# Altium footprint library 自建库.PcbLib: 169 footprints (part 8 of 11)
Each footprint in its own frame and in the unit in brackets; x right, y up, seen from the top. Pads: shape width x height; smd on the part's side, far side on the other; paste and mask are expansions set on the pad; w line width, h text height; cw(c..) or ccw(c..) is an arc to the next point about the centre after c.
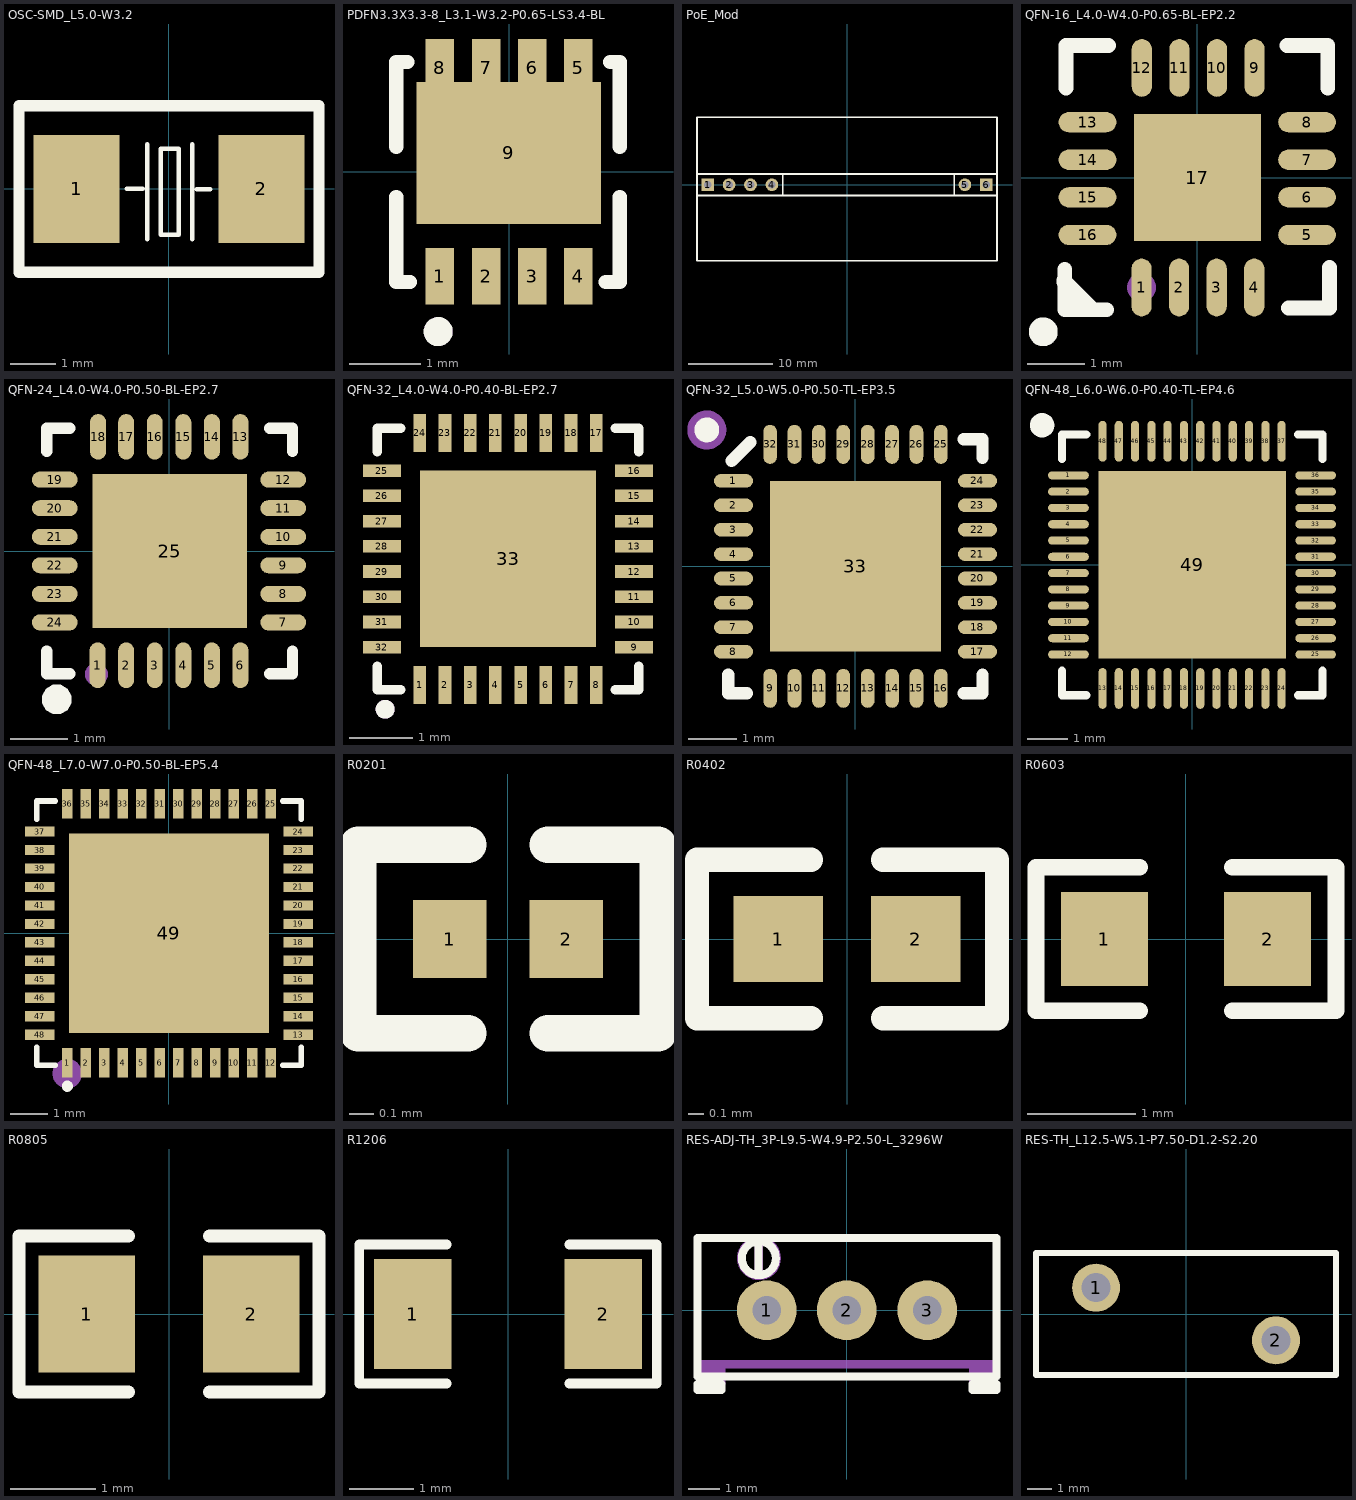
[diagram p7: the footprints below, top view; thin cyan lines are the x and y axes]

## OSC-SMD_L5.0-W3.2 [mm]
pads (2):
  rect 1.9x2.4 smd: 1(-2.05,0) 2(2.05,0)
Top Overlay:
  lines w0.1: -0.94,0 -0.584,0 ; -0.483,-1.109 -0.483,0.991 ; 0.517,-1.109 0.517,0.991 ; 0.617,-0.009 0.917,-0.009 ; -0.183,-1.009 -0.183,0.89 0.217,0.89 0.217,-1.009 -0.183,-1.009
  lines w0.254: -3.325,-1.85 3.325,-1.85 3.325,-0.7 3.325,0.7 3.325,1.85 -3.325,1.85 -3.325,0.7 -3.325,-0.7 -3.325,-1.85
3D body "OSC-5032_2.STEP": height 1.2, standoff -0.01, extent -2.569,-1.613 2.431,1.587

## PDFN3.3X3.3-8_L3.1-W3.2-P0.65-LS3.4-BL [mm]
pads (9):
  rect 0.4x0.8 smd paste-100 mask+0.051: 1(-0.975,-1.47) 2(-0.325,-1.47) 3(0.325,-1.47) 4(0.975,-1.47) 5(0.975,1.47) 6(0.325,1.47) 7(-0.325,1.47) 8(-0.975,1.47)
  rect 2.6x2 smd paste-100 mask+0.051: 9(-0.005,0.269)
Top Overlay:
  circle w0.2: c-1,-2.25 r0.105
  lines w0.2: -1.592,-0.354 -1.592,-1.55 -1.396,-1.55 ; -1.592,0.354 -1.592,1.55 -1.434,1.55 ; 1.362,-1.55 1.56,-1.55 1.56,-0.354 ; 1.425,1.55 1.56,1.55 1.56,0.354
Top Paste:
  region: -1.307,1.138 1.295,1.138 1.295,-0.731 -1.305,-0.731 -1.305,-0.73
  region: -1.175,-1.87 -1.175,-1.07 -0.775,-1.07 -0.775,-1.87
  region: -0.525,-1.87 -0.525,-1.07 -0.125,-1.07 -0.125,-1.87
  region: 0.125,-1.87 0.125,-1.07 0.525,-1.07 0.525,-1.87
  region: 0.775,-1.87 0.775,-1.07 1.175,-1.07 1.175,-1.87
  region: 1.175,1.47 0.775,1.47 0.775,1.87 1.175,1.87
  region: 0.525,1.47 0.125,1.47 0.125,1.87 0.525,1.87
  region: -0.125,1.47 -0.525,1.47 -0.525,1.87 -0.125,1.87
  region: -0.775,1.473 -1.175,1.473 -1.175,1.873 -0.775,1.873
Mechanical 15:
  circle w0.2: c-1,-2.25 r0.1
3D body "C2839901.stp": height 0.82, standoff 0, extent -1.65,-1.612 1.65,1.739

## PoE_Mod [mm] "PoE模块"
pads (6):
  rect 1.5x1.5 hole 0.9: 1(-16.53,0) 6(16.53,0)
  round 1.5 hole 0.9: 2(-13.99,0) 3(-11.45,0) 4(-8.91,0) 5(13.99,0)
Top Overlay:
  lines w0.2: -17.8,-1.27 -17.8,-9 17.8,-9 17.8,-1.27 ; -17.8,-1.27 -7.64,-1.27 -7.64,1.27 -17.8,1.27 ; -17.8,-1.27 -17.8,1.27 ; -17.8,-1.27 17.8,-1.27 ; -17.8,1.27 -17.8,8 17.8,8 17.8,1.27 ; -17.8,1.27 17.8,1.27 ; 17.8,-1.27 17.8,1.27 ; 17.8,-1.27 12.72,-1.27 12.72,1.27 17.8,1.27 ; 17.8,-1.27 17.8,1.27
3D body "POE_Mode.stp": height 14, standoff -1.8, extent -17.676,-7.747 18.184,6.053

## QFN-16_L4.0-W4.0-P0.65-BL-EP2.2 [mm]
pads (17):
  oval 0.35x1 smd: 1(-0.965,-1.9) 2(-0.315,-1.9) 3(0.335,-1.9) 4(0.986,-1.9) 9(0.991,1.9) 10(0.34,1.9) 11(-0.31,1.9) 12(-0.96,1.9)
  oval 1x0.35 smd: 5(1.9,-0.991) 6(1.9,-0.34) 7(1.9,0.31) 8(1.9,0.96) 13(-1.9,0.96) 14(-1.9,0.31) 15(-1.9,-0.34) 16(-1.9,-0.991)
  rect 2.2x2.2 smd: 17(0,0)
Top Overlay:
  circle w0.25: c-2.667,-2.667 r0.125
  region: -2.315,-1.777 -2.307,-2.302 -1.781,-2.302
  lines w0.254: -2.307,-1.809 -2.307,-1.774 ; -2.295,-1.793 -1.802,-2.286 ; -2.295,-1.583 -2.295,-2.286 -1.566,-2.286 ; -2.272,1.552 -2.272,2.286 -1.538,2.286 ; 1.553,2.286 2.257,2.286 2.257,1.552 ; 1.578,-2.257 2.286,-2.257 2.286,-1.553
Mechanical 15:
  circle w0.25: c-0.965,-1.9 r0.125
3D body "QFN16 4x4.STEP": height 0.92, standoff 0, extent -2,-2 2,2

## QFN-24_L4.0-W4.0-P0.50-BL-EP2.7 [mm]
pads (25):
  oval 0.28x0.8 smd: 1(-1.25,-2) 2(-0.75,-2) 3(-0.25,-2) 4(0.25,-2) 5(0.75,-2) 6(1.25,-2) 13(1.25,2) 14(0.75,2) 15(0.25,2) 16(-0.25,2) 17(-0.75,2) 18(-1.242,2)
  oval 0.8x0.28 smd: 7(2,-1.25) 8(2,-0.75) 9(2,-0.25) 10(2,0.25) 11(2,0.75) 12(2,1.25) 19(-2,1.25) 20(-2,0.75) 21(-2,0.25) 22(-2,-0.25) 23(-2,-0.75) 24(-2,-1.25)
  rect 2.7x2.7 smd: 25(0.012,0)
Top Overlay:
  region: -1.709,-2.598 -1.71,-2.53 -1.778,-2.413 -1.896,-2.345 -2.032,-2.346 -2.149,-2.414 -2.217,-2.532 -2.217,-2.668 -2.149,-2.785 -2.032,-2.853 -1.896,-2.854 -1.778,-2.786 -1.71,-2.669 -1.709,-2.601
  lines w0.2: -2.138,-1.75 -2.138,-2.15 -1.738,-2.15 ; -2.138,1.75 -2.138,2.15 -1.738,2.15 ; 1.763,-2.15 2.163,-2.15 2.163,-1.75 ; 1.763,2.15 2.163,2.15 2.163,1.75
Top Paste:
  drawing of 25 lines, arcs and shapes, not listed
Mechanical 15:
  circle w0.2: c-1.27,-2.159 r0.1
3D body "qfn-24.STEP": height 0.88, standoff -0.02, extent -2.02,-2.02 2.02,2.02

## QFN-32_L4.0-W4.0-P0.40-BL-EP2.7 [mm]
pads (33):
  rect 0.2x0.6 smd: 1(467.528,-331.212) 2(467.928,-331.212) 3(468.328,-331.212) 4(468.728,-331.212) 5(469.128,-331.212) 6(469.528,-331.212) 7(469.928,-331.212) 8(470.328,-331.212) 17(470.328,-327.212) 18(469.928,-327.212) 19(469.528,-327.212) 20(469.128,-327.212) 21(468.728,-327.212) 22(468.328,-327.212) 23(467.928,-327.212) 24(467.528,-327.212)
  rect 0.6x0.2 smd: 9(470.928,-330.612) 10(470.928,-330.212) 11(470.928,-329.811) 12(470.928,-329.411) 13(470.928,-329.012) 14(470.928,-328.612) 15(470.928,-328.212) 16(470.928,-327.811) 25(466.928,-327.811) 26(466.928,-328.212) 27(466.928,-328.612) 28(466.928,-329.012) 29(466.928,-329.411) 30(466.928,-329.811) 31(466.928,-330.212) 32(466.928,-330.612)
  rect 2.8x2.8 smd: 33(468.928,-329.212)
Top Overlay:
  circle w0.15: c466.979,-331.597 r0.075
  lines w0.152: 466.852,-330.914 466.852,-331.288 467.225,-331.288 ; 466.852,-327.509 466.852,-327.135 467.225,-327.135 ; 470.63,-331.288 471.004,-331.288 471.004,-330.914 ; 470.63,-327.135 471.004,-327.135 471.004,-327.509
Top Paste:
  region: 467.808,-330.332 467.808,-328.092 470.048,-328.092 470.048,-330.332
  region: 467.228,-327.911 467.228,-327.711 466.628,-327.711 466.628,-327.911
  region: 467.228,-328.312 467.228,-328.112 466.628,-328.112 466.628,-328.312
  region: 467.228,-328.712 467.228,-328.512 466.628,-328.512 466.628,-328.712
  region: 467.228,-329.112 467.228,-328.912 466.628,-328.912 466.628,-329.112
  region: 467.228,-329.511 467.228,-329.311 466.628,-329.311 466.628,-329.511
  region: 467.228,-329.911 467.228,-329.711 466.628,-329.711 466.628,-329.911
  region: 467.228,-330.312 467.228,-330.112 466.628,-330.112 466.628,-330.312
  region: 467.228,-330.712 467.228,-330.512 466.628,-330.512 466.628,-330.712
  region: 470.428,-330.912 470.228,-330.912 470.228,-331.512 470.428,-331.512
  region: 470.028,-330.912 469.828,-330.912 469.828,-331.512 470.028,-331.512
  region: 469.628,-330.912 469.428,-330.912 469.428,-331.512 469.628,-331.512
  region: 469.228,-330.912 469.028,-330.912 469.028,-331.512 469.228,-331.512
  region: 468.828,-330.912 468.628,-330.912 468.628,-331.512 468.828,-331.512
  region: 468.428,-330.912 468.228,-330.912 468.228,-331.512 468.428,-331.512
  region: 468.028,-330.912 467.828,-330.912 467.828,-331.512 468.028,-331.512
  region: 467.628,-330.912 467.428,-330.912 467.428,-331.512 467.628,-331.512
  region: 471.228,-330.712 471.228,-330.512 470.628,-330.512 470.628,-330.712
  region: 471.228,-330.312 471.228,-330.112 470.628,-330.112 470.628,-330.312
  region: 471.228,-329.911 471.228,-329.711 470.628,-329.711 470.628,-329.911
  region: 471.228,-329.511 471.228,-329.311 470.628,-329.311 470.628,-329.511
  region: 471.228,-329.112 471.228,-328.912 470.628,-328.912 470.628,-329.112
  region: 471.228,-328.712 471.228,-328.512 470.628,-328.512 470.628,-328.712
  region: 471.228,-328.312 471.228,-328.112 470.628,-328.112 470.628,-328.312
  region: 471.228,-327.911 471.228,-327.711 470.628,-327.711 470.628,-327.911
  region: 470.428,-326.912 470.228,-326.912 470.228,-327.512 470.428,-327.512
  region: 470.028,-326.912 469.828,-326.912 469.828,-327.512 470.028,-327.512
  region: 469.628,-326.912 469.428,-326.912 469.428,-327.512 469.628,-327.512
  region: 469.228,-326.912 469.028,-326.912 469.028,-327.512 469.228,-327.512
  region: 468.828,-326.912 468.628,-326.912 468.628,-327.512 468.828,-327.512
  region: 468.428,-326.912 468.228,-326.912 468.228,-327.512 468.428,-327.512
  region: 468.028,-326.912 467.828,-326.912 467.828,-327.512 468.028,-327.512
  region: 467.628,-326.912 467.428,-326.912 467.428,-327.512 467.628,-327.512
Mechanical 15:
  circle w0.15: c466.979,-331.597 r0.075
3D body "sc8701.stp": height 0.82, standoff 0, extent 466.918,-331.222 470.938,-327.202

## QFN-32_L5.0-W5.0-P0.50-TL-EP3.5 [mm]
pads (33):
  oval 0.8x0.28 smd: 1(-2.5,1.75) 2(-2.5,1.25) 3(-2.5,0.75) 4(-2.5,0.25) 5(-2.5,-0.25) 6(-2.5,-0.75) 7(-2.5,-1.25) 8(-2.5,-1.75) 17(2.5,-1.75) 18(2.5,-1.25) 19(2.5,-0.75) 20(2.5,-0.25) 21(2.5,0.25) 22(2.5,0.75) 23(2.5,1.25) 24(2.5,1.75)
  oval 0.28x0.8 smd: 9(-1.75,-2.5) 10(-1.25,-2.5) 11(-0.75,-2.5) 12(-0.25,-2.5) 13(0.25,-2.5) 14(0.75,-2.5) 15(1.25,-2.5) 16(1.75,-2.5) 25(1.75,2.5) 26(1.25,2.5) 27(0.75,2.5) 28(0.25,2.5) 29(-0.25,2.5) 30(-0.75,2.5) 31(-1.25,2.5) 32(-1.75,2.5)
  rect 3.5x3.5 smd: 33(0,0)
Top Overlay:
  circle w0.254: c-3.048,2.794 r0.127
  lines w0.254: -2.604,-2.222 -2.604,-2.603 -2.223,-2.603 ; -2.54,2.159 -2.159,2.54 ; 2.222,-2.603 2.603,-2.603 2.603,-2.222 ; 2.222,2.604 2.603,2.604 2.603,2.223
Top Paste:
  drawing of 33 lines, arcs and shapes, not listed
Mechanical 15:
  circle w0.4: c-3.048,2.794 r0.2
3D body "QFN32-1.STEP": height 0.9, standoff -0.03, extent -2.5,-2.5 2.5,2.5

## QFN-48_L6.0-W6.0-P0.40-TL-EP4.6 [mm]
pads (49):
  oval 1x0.2 smd: 1(-3.036,2.199) 2(-3.036,1.798) 3(-3.036,1.399) 4(-3.036,0.998) 5(-3.036,0.599) 6(-3.036,0.198) 7(-3.036,-0.201) 8(-3.036,-0.601) 9(-3.036,-1.001) 10(-3.036,-1.401) 11(-3.036,-1.801) 12(-3.036,-2.201) 25(3.036,-2.201) 26(3.036,-1.801) 27(3.036,-1.401) 28(3.036,-1.001) 29(3.036,-0.602) 30(3.036,-0.201) 31(3.036,0.199) 32(3.036,0.599) 33(3.036,0.999) 34(3.036,1.398) 35(3.036,1.799) 36(3.036,2.199)
  oval 0.2x1 smd: 13(-2.199,-3.036) 14(-1.799,-3.036) 15(-1.399,-3.036) 16(-0.999,-3.036) 17(-0.599,-3.036) 18(-0.199,-3.036) 19(0.201,-3.036) 20(0.601,-3.036) 21(1.001,-3.036) 22(1.401,-3.036) 23(1.801,-3.036) 24(2.201,-3.036) 37(2.201,3.036) 38(1.801,3.036) 39(1.401,3.036) 40(1.001,3.036) 41(0.601,3.036) 42(0.201,3.036) 43(-0.198,3.036) 44(-0.599,3.036) 45(-0.999,3.036) 46(-1.399,3.036) 47(-1.799,3.036) 48(-2.198,3.036)
  rect 4.6x4.6 smd: 49(0.003,0)
Top Overlay:
  lines w0.2: -3.198,-2.601 -3.198,-3.201 -2.598,-3.201 ; -3.198,2.599 -3.198,3.199 -2.598,3.199 ; 2.602,-3.201 3.202,-3.201 3.202,-2.601 ; 2.602,3.199 3.202,3.199 3.202,2.599
  lines w0.3: -3.533,3.428 cw(c-3.683,3.429) -3.533,3.43
Mechanical 15:
  circle w0.254: c-3.683,3.429 r0.123
3D body "QFN-48 6x6 pitch 0_4.STEP": height 0.65, standoff -0.02, extent -3.017,-3.02 3.023,3.02

## QFN-48_L7.0-W7.0-P0.50-BL-EP5.4 [mm]
pads (49):
  rect 0.28x0.8 smd: 1(-2.75,-3.5) 2(-2.25,-3.5) 3(-1.75,-3.5) 4(-1.25,-3.5) 5(-0.75,-3.5) 6(-0.25,-3.5) 7(0.25,-3.5) 8(0.75,-3.5) 9(1.25,-3.5) 10(1.75,-3.5) 11(2.25,-3.5) 12(2.75,-3.5) 25(2.75,3.5) 26(2.25,3.5) 27(1.75,3.5) 28(1.25,3.5) 29(0.75,3.5) 30(0.25,3.5) 31(-0.25,3.5) 32(-0.75,3.5) 33(-1.25,3.5) 34(-1.75,3.5) 35(-2.25,3.5) 36(-2.75,3.5)
  rect 0.8x0.28 smd: 13(3.5,-2.75) 14(3.5,-2.25) 15(3.5,-1.75) 16(3.5,-1.25) 17(3.5,-0.75) 18(3.5,-0.25) 19(3.5,0.25) 20(3.5,0.75) 21(3.5,1.25) 22(3.5,1.75) 23(3.5,2.25) 24(3.5,2.75) 37(-3.5,2.75) 38(-3.5,2.25) 39(-3.5,1.75) 40(-3.5,1.25) 41(-3.5,0.75) 42(-3.5,0.25) 43(-3.5,-0.25) 44(-3.5,-0.75) 45(-3.5,-1.25) 46(-3.5,-1.75) 47(-3.5,-2.25) 48(-3.5,-2.75)
  rect 5.4x5.4 smd: 49(0,0)
Top Overlay:
  circle w0.15: c-2.75,-4.14 r0.075
  lines w0.152: -3.576,-3.08 -3.576,-3.576 -3.08,-3.576 ; -3.576,3.081 -3.576,3.576 -3.08,3.576 ; 3.081,-3.576 3.576,-3.576 3.576,-3.08 ; 3.081,3.576 3.576,3.576 3.576,3.081
Top Paste:
  drawing of 49 lines, arcs and shapes, not listed
Mechanical 15:
  circle w0.4: c-2.75,-3.8 r0.2
3D body "QFN48_7x7.STEP": height 0.78, standoff -0.02, extent -3.51,-3.51 3.51,3.51

## R0201 [mm]
pads (2):
  rect 0.303x0.324 smd: 1(-0.242,0) 2(0.242,0)
Top Overlay:
  lines w0.152: -0.166,-0.391 -0.622,-0.391 -0.622,0.391 -0.166,0.391 ; 0.166,-0.391 0.622,-0.391 0.622,0.391 0.166,0.391
Top Paste:
  region: 0.081,-0.138 0.081,0.138 0.105,0.162 0.369,0.162 0.393,0.138 0.393,-0.138 0.369,-0.162 0.105,-0.162
  region: -0.081,-0.138 -0.081,0.138 -0.105,0.162 -0.369,0.162 -0.393,0.138 -0.393,-0.138 -0.369,-0.162 -0.105,-0.162
3D body "RES0201.STEP": height 0.15, standoff 0, extent -0.3,-0.15 0.3,0.15

## R0402 [mm]
pads (2):
  rect 0.566x0.54 smd: 1(-0.433,0) 2(0.433,0)
Top Overlay:
  lines w0.152: -0.226,-0.499 -0.944,-0.499 -0.944,0.499 -0.226,0.499 ; 0.226,-0.499 0.944,-0.499 0.944,0.499 0.226,0.499
Top Paste:
  region: -0.135,-0.23 -0.135,0.23 -0.175,0.27 -0.676,0.27 -0.716,0.23 -0.716,-0.23 -0.676,-0.27 -0.175,-0.27
  region: 0.135,-0.23 0.135,0.23 0.175,0.27 0.676,0.27 0.716,0.23 0.716,-0.23 0.676,-0.27 0.175,-0.27
3D body "RES0402-2.STEP": height 0.35, standoff 0, extent -0.5,-0.25 0.5,0.25

## R0603 [mm]
pads (2):
  rect 0.806x0.864 smd: 1(-0.753,0) 2(0.753,0)
Top Overlay:
  lines w0.152: -0.426,-0.661 -1.385,-0.661 -1.385,0.661 -0.426,0.661 ; 0.426,-0.661 1.385,-0.661 1.385,0.661 0.426,0.661
Top Paste:
  region: 1.195,0.45 0.395,0.45 0.345,0.4 0.345,0.172 0.715,0.172 0.715,-0.158 0.345,-0.158 0.345,-0.4 0.395,-0.45 1.195,-0.45 1.245,-0.4 1.245,0.4
  region: -0.355,0.4 -0.355,0.172 -0.735,0.172 -0.735,-0.158 -0.355,-0.158 -0.355,-0.4 -0.405,-0.45 -1.195,-0.45 -1.245,-0.4 -1.245,0.4 -1.195,0.45 -0.405,0.45
3D body "RES0603-3.STEP": height 0.45, standoff 0, extent -0.8,-0.4 0.8,0.4

## R0805 [mm]
pads (2):
  rect 1.133x1.377 smd: 1(-0.966,0) 2(0.966,0)
Top Overlay:
  lines w0.152: -0.476,-0.917 -1.761,-0.917 -1.761,0.917 -0.476,0.917 ; 0.476,-0.917 1.761,-0.917 1.761,0.917 0.476,0.917
Top Paste:
  region: -1.7,-0.64 -1.7,0.64 -1.65,0.69 -0.5,0.69 -0.45,0.64 -0.445,0.23 -0.895,0.23 -0.895,-0.22 -0.455,-0.22 -0.45,-0.64 -0.5,-0.69 -1.65,-0.69
  region: 0.45,-0.64 0.45,-0.22 0.895,-0.22 0.895,0.23 0.455,0.23 0.45,0.64 0.5,0.69 1.65,0.69 1.7,0.64 1.7,-0.64 1.65,-0.69 0.5,-0.69
3D body "RES0805-2.STEP": height 0.55, standoff 0, extent -1,-0.625 1,0.625

## R1206 [mm]
pads (2):
  rect 1.208x1.701 smd: 1(-1.479,0) 2(1.479,0)
Top Overlay:
  lines w0.152: -0.951,-1.079 -2.311,-1.079 -2.311,1.079 -0.951,1.079 ; 0.951,-1.079 2.311,-1.079 2.311,1.079 0.951,1.079
Top Paste:
  region: 0.875,-0.75 0.875,-0.389 0.975,-0.289 1.186,-0.289 1.286,-0.189 1.286,0.189 1.186,0.289 0.975,0.289 0.875,0.389 0.875,0.75 0.975,0.85 1.983,0.85 2.083,0.75 2.083,-0.75 1.983,-0.85 0.975,-0.85
  region: -0.875,-0.75 -0.875,-0.389 -0.975,-0.289 -1.186,-0.289 -1.286,-0.189 -1.286,0.189 -1.186,0.289 -0.975,0.289 -0.875,0.389 -0.875,0.75 -0.975,0.85 -1.983,0.85 -2.083,0.75 -2.083,-0.75 -1.983,-0.85 -0.975,-0.85
3D body "R1206.stp": height 0.56, standoff 0, extent -1.6,-0.81 1.6,0.81

## RES-ADJ-TH_3P-L9.5-W4.9-P2.50-L_3296W [mm]
pads (3):
  round 1.9 hole 0.9 paste+0 mask+0.051: 1(-2.55,0) 2(-0.01,0) 3(2.55,0)
Top Overlay:
  lines w0.254: -2.804,1.27 -2.804,1.651 ; -2.804,2.189 ccw(c-2.799,1.651) -2.794,2.189 ; -2.804,1.651 -2.804,2.032 -2.804,1.651 ; -4.75,-2.54 -4.75,-2.34 -3.988,-2.34 -3.988,-2.54 -4.75,-2.54 ; -4.75,-2.1 -4.75,2.3 4.75,2.3 4.75,-2.1 -4.75,-2.1 ; 3.988,-2.54 3.988,-2.34 4.75,-2.34 4.75,-2.54 3.988,-2.54
Mechanical 15:
  circle w0.254: c-2.794,1.651 r0.568
  region: -4.762,-2.349 -4.762,-1.587 4.763,-1.587 4.763,-2.476 3.874,-2.476 3.874,-1.841 -3.873,-1.841 -3.873,-2.349
  region: -2.921,2.159 -2.667,2.159 -2.667,1.143 -2.921,1.143
3D body "C118939.stp": height 11.5, standoff -3.5, extent -4.76,-2.4 4.74,2.45

## RES-TH_L12.5-W5.1-P7.50-D1.2-S2.20 [mm]
pads (2):
  round 2 hole 1.2 paste+0 mask+0.051: 1(-3.749,1.1) 2(3.749,-1.1)
Top Overlay:
  lines w0.254: -6.252,-2.55 6.25,-2.55 6.25,2.55 -6.25,2.55 -6.25,-2.55
3D body "res.stp": height 13.75, standoff -3.5, extent -6.25,-2.942 6.25,2.942